# Altium footprint library hphonglib.PcbLib: 703 footprints (part 13 of 44)
Each footprint in its own frame and in the unit in brackets; x right, y up, seen from the top. Pads: shape width x height; smd on the part's side, far side on the other; paste and mask are expansions set on the pad; w line width, h text height; cw(c..) or ccw(c..) is an arc to the next point about the centre after c.
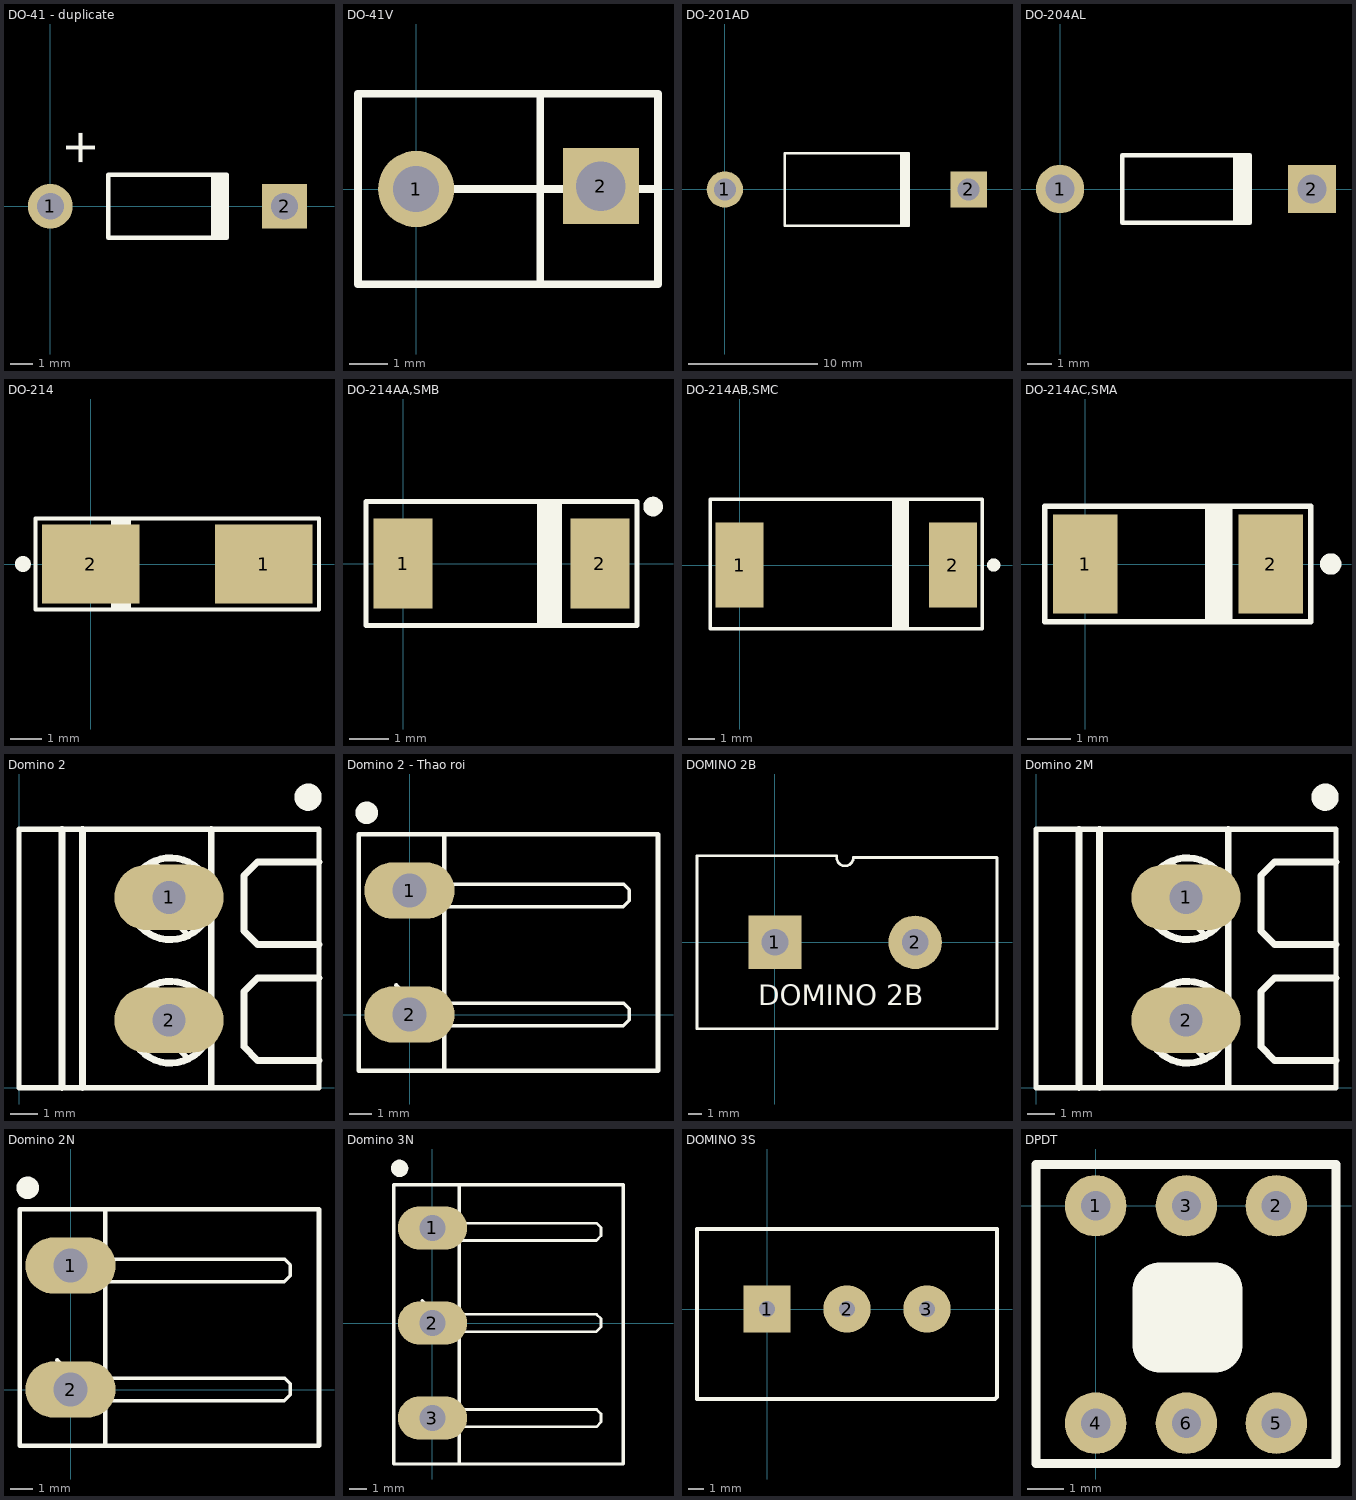
[diagram p12: the footprints below, top view; thin cyan lines are the x and y axes]

## DO-41 - duplicate [mm] "Diode, Axial; Body 5.2 x 2.7 mm (LxDia. max), Lead Dia. 0.86 mm (max)"
height 2.8
pads (2):
  round 2 hole 1.2: 1(0,0)
  rect 2x2 hole 1.2: 2(10.46,0)
Top Overlay:
  rectangle: 7.18,-1.4 7.98,1.4
  lines w0.2: 7.88,-1.4 2.58,-1.4 2.58,1.4 7.88,1.4
  text "+" at 1.995,1.743 h1.52
Bottom Overlay:
  lines w0.254: -1.4,-1.725 12,-1.725 12,1.7 -1.4,1.7 -1.4,-1.725
3D body: height 2.3, standoff 1.7, extent 7.7,-0.3 10.5,0.299
3D body: height 2.3, standoff 1.7, extent -0.075,-0.299 2.725,0.299
3D body: height 3.3, standoff 0.69, extent 7,-1.332 7.8,1.282
3D body: height 2.1, standoff -1, extent 10.15,-0.299 10.748,0.299
3D body: height 2.1, standoff -1, extent -0.298,-0.324 0.3,0.274
3D body: height 3.29, standoff 0.7, extent 2.75,-1.322 7.75,1.272

## DO-41V [mm]
pads (2):
  round 2 hole 1.2: 1(0,0)
  rect 2x2 hole 1.3: 2(4.851,0.076)
Top Overlay:
  lines w0.2: 0.225,0 2.8,0 ; 1.2,0 6.35,0 ; 3.258,-2.5 3.258,2.5 ; 6.35,0 6.35,2.5 -1.524,2.5 -1.524,-2.5 6.35,-2.5 6.35,0
3D body: height 15.69, standoff -3, extent -2.848,-2.857 5.692,2.743

## DO-201AD [mm] "Diode FR30x, Axial; Body 9.5 x 5.6 mm (LxDia. max), Lead Dia. 1.32 mm (max)"
height 5.6
pads (2):
  round 2.8 hole 1.7: 1(0,0)
  rect 2.8x2.8 hole 1.7: 2(18.84,0)
Top Overlay:
  rectangle: 13.52,-2.8 14.32,2.8
  lines w0.2: 14.22,-2.8 4.62,-2.8 4.62,2.8 14.22,2.8
Bottom Overlay:
  lines w0.254: -2.15,-3.025 -2.15,3.1 21.025,3.1 21.025,-3.025 -2,-3.025 -2.15,-3.025
3D body: height 5.79, standoff 0.19, extent 12.625,-2.804 14.625,2.804
3D body: height 3.6, standoff 2.4, extent -0.275,-0.598 4.225,0.6
3D body: height 3.6, standoff 2.4, extent 14.525,-0.6 19.025,0.598
3D body: height 3.1, standoff -1, extent 18.25,-0.649 19.445,0.548
3D body: height 3.1, standoff -1, extent -0.623,-0.598 0.573,0.6
3D body: height 5.78, standoff 0.2, extent 4.2,-2.8 14.2,2.789

## DO-204AL [mm] "Diode, Axial; Body 5.2 x 2.7 mm (LxDia. max), Lead Dia. 0.86 mm (max)"
height 2.7
pads (2):
  round 2 hole 1.2: 1(0,0)
  rect 2x2 hole 1.2: 2(10.46,0)
Top Overlay:
  rectangle: 7.18,-1.4 7.98,1.4
  lines w0.2: 7.88,-1.4 2.58,-1.4 2.58,1.4 7.88,1.4

## DO-214 [mm]
pads (2):
  rect 3.1x2.5 smd: 1(5.5,0) 2(0,0)
Top Overlay:
  circle w0.25: c-2.157,0 r0.125
  rectangle: 0.635,-1.45 1.27,1.45
  lines w0.127: -1.75,-1.45 -1.75,1.45 7.25,1.45 7.25,-1.45 -1.75,-1.45

## DO-214AA,SMB [mm]
pads (2):
  rect 1.5x2.3 smd: 1(0,0) 2(5,0)
Top Overlay:
  circle w0.25: c6.352,1.448 r0.125
  rectangle: 3.404,-1.6 4.039,1.575
  lines w0.127: -0.95,-1.575 -0.95,1.575 5.944,1.575 5.944,-1.575 -0.95,-1.575
3D body: height 2.3, standoff 0, extent -0.185,-1.778 5.215,1.822

## DO-214AB,SMC [mm]
height 0.508
pads (2):
  rect 1.8x3.2 smd: 1(0,0) 2(8,0)
Top Overlay:
  circle w0.25: c9.527,0 r0.125
  rectangle: 5.715,-2.388 6.35,2.464
  lines w0.127: -1.1,-2.388 -1.1,2.464 9.1,2.464 9.1,-2.388 -1.1,-2.388
3D body: height 2.3, standoff 0, extent 0.038,-2.972 7.988,2.928

## DO-214AC,SMA [mil]
pads (2):
  rect 59.06x90.55 smd: 1(0,0) 2(170,0)
Top Overlay:
  circle w9.84: c225.08,0 r4.92
  rectangle: 110,-53.15 135,53.15
  lines w5: -37.4,-53.15 206.69,-53.15 206.69,53.15 -37.4,53.15 -37.4,-53.15
3D body: height 94.69, standoff 0, extent -17.36,-51 187.36,51.36

## Domino 2 [mm]
pads (2):
  oval 4x2.4 hole 1.2: 1(5.5,6.975) 2(5.5,2.475)
Top Overlay:
  circle w0.254: c5.55,6.925 r1.5
  circle w0.254: c5.55,2.4 r1.5
  circle w0.5: c10.6,10.65 r0.25
  lines w0.2: 4.2,3.075 6.2,1.075 ; 4.2,7.6 6.2,5.6 ; 4.912,3.762 6.913,1.762 ; 4.912,8.287 6.913,6.287 ; 0,0 11,0 11,9.475 0,9.475 0,0
  lines w0.254: 1.575,0 1.575,9.475 ; 2.325,0 2.325,9.475 ; 7.05,0.025 7.05,9.475 ; 11,1 8.75,1 8.25,1.5 8.25,3.525 8.75,4.025 11,4.025 ; 11,5.25 8.75,5.25 8.25,5.75 8.25,7.775 8.75,8.275 11,8.275
3D body: height 8.5, standoff 4.5, extent 2.8,0.975 7.5,8.475
3D body: height 4.5, standoff 0.01, extent 0,0 11,9.475
3D body: height 2.5, standoff -1, extent 4.964,1.889 6.086,3.011
3D body: height 2.5, standoff -1, extent 4.964,6.414 6.086,7.536
3D body: height 8.55, standoff 7.6, extent 4.391,1.416 6.659,3.484
3D body: height 8.6, standoff 7.6, extent 4.496,1.517 5.404,3.383
3D body: height 8.6, standoff 7.6, extent 5.654,1.525 6.562,3.391
3D body: height 8.6, standoff 7.6, extent 5.654,6.05 6.562,7.916
3D body: height 8.6, standoff 7.6, extent 4.496,6.042 5.404,7.908
3D body: height 8.55, standoff 7.6, extent 4.391,5.941 6.659,8.009
3D body: height 3.5, standoff 1, extent 9.263,1.838 10.25,3.355
3D body: height 3.5, standoff 1, extent 9.263,6.188 10.25,7.705

## Domino 2 - Thao roi [mm]
pads (2):
  oval 4x2.5 hole 1.5: 1(0,5.5) 2(0,0)
Top Overlay:
  circle w0.5: c-1.9,8.95 r0.25
  lines w0.15: 1.55,-0.6 1.65,-0.5 9.475,-0.5 9.75,-0.225 9.75,0.25 9.5,0.5 1.55,0.5 ; 1.55,4.675 1.65,4.775 9.475,4.775 9.75,5.05 9.75,5.525 9.5,5.775 1.55,5.775
  lines w0.2: -0.587,1.287 1.413,-0.713 ; 1.55,-2.5 1.55,7.925 ; -2.25,-2.5 -2.25,8 11.025,8 11.025,-2.5 -2.25,-2.5
Bottom Overlay:
  lines w0.1: -2.286,-2.489 -2.286,7.976 11.024,7.976 11.024,-2.489 -2.286,-2.489
3D body: height 9, standoff 7.9, extent 8.458,-2.489 11.074,8.001
3D body: height 5.5, standoff 4.5, extent 0,5.001 10,5.999
3D body: height 5.5, standoff 4.5, extent 0,-0.499 10,0.499
3D body: height 8, standoff 1, extent -1.092,-2.54 0.254,7.925
3D body: height 1, standoff 0.1, extent -1.092,-2.489 11.074,7.976
3D body: height 8, standoff 7, extent -1.092,-2.489 11.074,7.976

## DOMINO 2B [mm]
pads (2):
  rect 4x4 hole 2: 1(0,0)
  round 4 hole 2: 2(10.5,0)
Top Overlay:
  lines w0.2: 4.625,6.35 ccw(c5.25,6.35) 5.875,6.35 16.637,6.35 16.637,-6.477 -5.842,-6.477 -5.842,6.477 4.625,6.477
  text "DOMINO 2B" at -1.27,-4.699 h1.52

## Domino 2M [mm]
pads (2):
  oval 4x2.4 hole 1.2: 1(5.5,6.975) 2(5.5,2.475)
Top Overlay:
  circle w0.254: c5.55,6.925 r1.5
  circle w0.254: c5.55,2.4 r1.5
  circle w0.5: c10.6,10.65 r0.25
  lines w0.2: 4.2,3.075 6.2,1.075 ; 4.2,7.6 6.2,5.6 ; 4.912,3.762 6.913,1.762 ; 4.912,8.287 6.913,6.287 ; 0,0 11,0 11,9.475 0,9.475 0,0
  lines w0.254: 1.575,0 1.575,9.475 ; 2.325,0 2.325,9.475 ; 7.05,0.025 7.05,9.475 ; 11,1 8.75,1 8.25,1.5 8.25,3.525 8.75,4.025 11,4.025 ; 11,5.25 8.75,5.25 8.25,5.75 8.25,7.775 8.75,8.275 11,8.275
3D body: height 10, standoff -4, extent 1.346,-0.225 8.846,9.775
3D body: height 8.6, standoff 7.6, extent 4.496,1.517 5.404,3.383
3D body: height 8.6, standoff 7.6, extent 5.654,1.525 6.562,3.391
3D body: height 8.6, standoff 7.6, extent 5.654,6.05 6.562,7.916
3D body: height 8.6, standoff 7.6, extent 4.496,6.042 5.404,7.908

## Domino 2N [mm]
pads (2):
  oval 4x2.5 hole 1.5: 1(0,5.5) 2(0,0)
Top Overlay:
  circle w0.5: c-1.9,8.95 r0.25
  lines w0.15: 1.55,-0.6 1.65,-0.5 9.475,-0.5 9.75,-0.225 9.75,0.25 9.5,0.5 1.55,0.5 ; 1.55,4.675 1.65,4.775 9.475,4.775 9.75,5.05 9.75,5.525 9.5,5.775 1.55,5.775
  lines w0.2: -0.587,1.287 1.413,-0.713 ; 1.55,-2.5 1.55,7.925 ; -2.25,-2.5 11.025,-2.5 11.025,8 -2.25,8 -2.25,-2.5
Bottom Overlay:
  lines w0.1: -2.286,-2.489 11.024,-2.489 11.024,7.976 -2.286,7.976 -2.286,-2.489
3D body: height 8.47, standoff -4, extent -1.758,-2.21 10.242,7.79

## Domino 3N [mm]
pads (3):
  oval 4x2.5 hole 1.5: 1(0,5.5) 2(0,0) 3(0,-5.5)
Top Overlay:
  circle w0.5: c-1.9,8.95 r0.25
  lines w0.15: 1.55,-6.1 1.65,-6 9.475,-6 9.75,-5.725 9.75,-5.25 9.5,-5 1.55,-5 ; 1.55,-0.6 1.65,-0.5 9.475,-0.5 9.75,-0.225 9.75,0.25 9.5,0.5 1.55,0.5 ; 1.55,4.675 1.65,4.775 9.475,4.775 9.75,5.05 9.75,5.525 9.5,5.775 1.55,5.775
  lines w0.2: -0.587,1.287 1.413,-0.713 ; 1.55,-8.153 1.55,7.925 ; -2.25,-8.153 11.025,-8.153 11.025,8 -2.25,8 -2.25,-8.153
Bottom Overlay:
  lines w0.1: -2.286,-8.153 11.024,-8.153 11.024,7.976 -2.286,7.976 -2.286,-8.153

## DOMINO 3S [mm] "3 terminal 5.04 spacing"
pads (3):
  rect 3x3 hole 1: 1(0,0)
  round 3 hole 1: 2(5.08,0) 3(10.16,0)
Top Overlay:
  lines w0.254: -4.445,-5.715 14.478,-5.715 14.605,-5.588 14.605,5.08 -4.445,5.08 -4.445,-5.715

## DPDT [mil] "Double-Pole, Double-Throw Switch; 6 Leads; Solder Pad 35mil"
pads (6):
  round 67 hole 32: 1(0,0) 2(197,0) 3(99,0) 4(0,-237) 5(197,-237) 6(99,-237)
Top Overlay:
  lines w10: -65,-281 262,-281 262,45 -65,45 -65,-281
  lines w60: 70,-152 130,-152 130,-92 70,-92 70,-152
3D body: height 531.5, standoff -137.8, extent -58.96,-275.48 256,39.48